# Altium footprint library SOCKET_CARD.PcbLib: 22 footprints (part 2 of 2)
Each footprint in its own frame and in the unit in brackets; x right, y up, seen from the top. Pads: shape width x height; smd on the part's side, far side on the other; paste and mask are expansions set on the pad; w line width, h text height; cw(c..) or ccw(c..) is an arc to the next point about the centre after c.
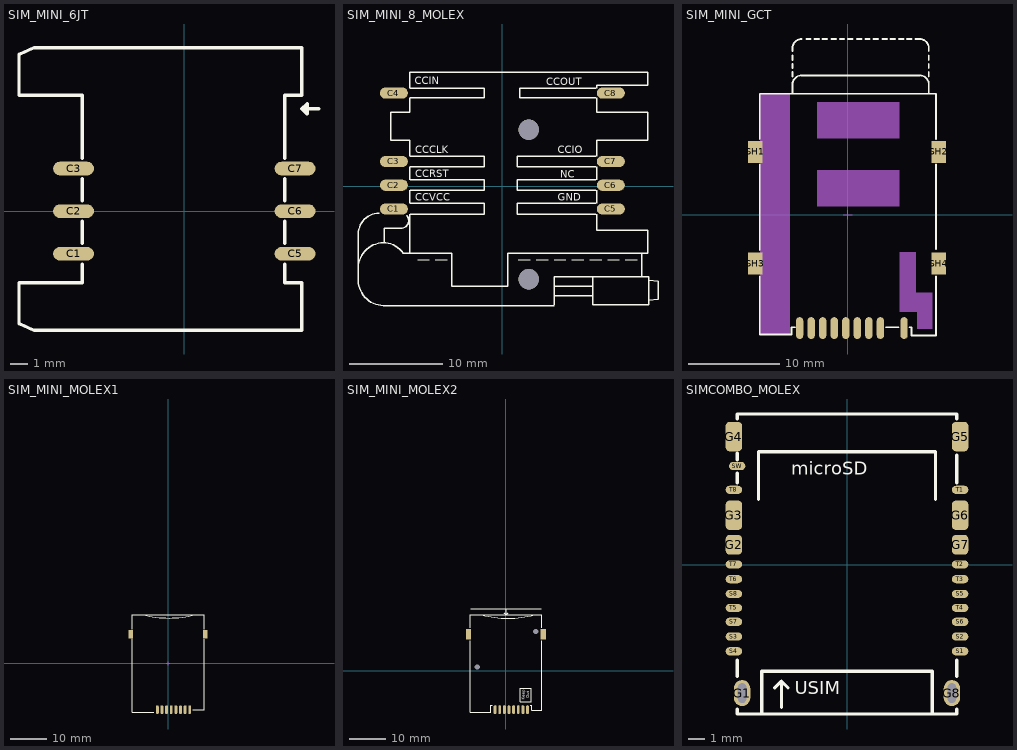
[diagram p1: the footprints below, top view; thin cyan lines are the x and y axes]

## SIM_MINI_6JT [mm] "SIM MINI, JTCONN"
height 0.254
pads (6):
  oval 2.4x0.8 smd: C1(-6.501,-2.499) C2(-6.501,0) C3(-6.501,2.499) C5(6.501,-2.499) C6(6.501,0) C7(6.501,2.499)
Top Overlay:
  lines w0.2: -9.7,-6.6 -8.8,-7 ; -9.7,-4.2 -6,-4.2 -6,-3.1 ; -8.8,9.6 -9.7,9.2 -9.7,6.8 -6,6.8 -6,3.1 ; -6,-1.9 -6,-0.6 ; -6,0.6 -6,1.9 ; 5.9,-3.1 5.9,-4.2 6.9,-4.2 ; 5.9,-1.9 5.9,-0.6 ; 5.9,0.6 5.9,1.9 ; 5.9,3.1 5.9,6.8 6.9,6.8 ; 7.9,6 6.9,6 ; 6.9,6 7.2,5.7 7.2,6.3 6.9,6
  lines w0.203: -9.7,-6.6 -9.7,-4.2 ; -8.8,-7 6.9,-7 6.9,-4.2 ; -8.8,9.6 6.9,9.6 6.9,6.8
3D body "User Library-Sim Card Holder.step": height 1.8, standoff 0, extent -9.55,-6.9 6.75,9.5
3D body "SIM card.STEP": height 1.55, standoff 0.75, extent -8.9,-6.2 16.1,8.8

## SIM_MINI_8_MOLEX [mm] "SIM 8P, MOLEX 91228-3001, 2.54mm Pitch ChipSIM Connector with Ejector, 6 Circuits, without Pegs, Yellow Button"
height 1.016
pads (10):
  oval 3x1.2 smd: C1(-11.608,-2.44) C2(-11.608,0.1) C3(-11.608,2.64) C4(-11.608,9.955) C5(11.608,-2.44) C6(11.608,0.1) C7(11.608,2.64) C8(11.608,9.955)
  round 2.184 hole 2.184 unplated: ""(2.826,-9.955) ""(2.826,6.045)
Top Overlay:
  lines w0.051: -9.068,-7.895 -7.798,-7.895 ; -7.163,-7.895 -5.893,-7.895 ; 1.727,-7.895 2.997,-7.895 ; 3.632,-7.895 4.902,-7.895 ; 5.537,-7.895 6.807,-7.895 ; 7.442,-7.895 8.712,-7.895 ; 9.347,-7.895 10.617,-7.895 ; 11.252,-7.895 12.522,-7.895 ; 13.157,-7.895 14.427,-7.895
  lines w0.152: -15.418,-8.714 cw(c-12.687,-8.777) -12.751,-6.047 cw(c-12.781,-8.714) -10.592,-7.19 ; -15.418,-5.155 -15.418,-10.111 ccw(c-12.687,-10.047) -12.751,-12.778 5.537,-12.778 ; -15.418,-5.102 cw(c-13.145,-5.155) -13.198,-2.882 ; -12.624,-4.523 -12.618,-4.523 ; -12.618,-6.047 -12.618,-4.523 ; -10.592,-7.205 -9.924,-7.205 ; -10.24,-3.137 cw(c-10.846,-3.697) -10.846,-4.523 -12.618,-4.523 ; -9.924,-2.999 -9.924,-7.205 ; -9.924,-1.856 -9.924,-0.459 ; -9.924,0.684 -9.924,2.081 ; -9.924,3.224 -9.924,4.93 -11.924,4.93 -11.924,7.93 -9.924,7.93 -9.924,9.447 ; -9.924,10.463 -9.924,12.168 15.576,12.168 15.576,10.795 10.076,10.795 10.076,10.463 ; -9.83,-2.999 -1.956,-2.999 -1.956,-1.856 -9.83,-1.856 ; -9.83,-0.459 -1.956,-0.459 -1.956,0.684 -9.83,0.684 ; -9.83,2.081 -1.956,2.081 -1.956,3.224 -9.83,3.224 ; -9.83,9.447 -1.956,9.447 -1.956,10.463 -9.83,10.463 ; 5.576,-12.705 5.576,-11.705 ; 9.982,-2.999 1.6,-2.999 1.6,-1.856 9.982,-1.856 ; 9.982,-0.459 1.6,-0.459 1.6,0.684 9.982,0.684 ; 9.982,2.081 1.6,2.081 1.6,3.224 9.982,3.224 ; 9.982,9.447 1.854,9.447 1.854,10.463 9.982,10.463 ; 10.076,-2.999 10.076,-4.705 15.576,-4.705 15.576,-7.205 14.916,-7.205 ; 10.076,-1.856 10.076,-0.459 ; 10.076,0.684 10.076,2.081 ; 10.076,3.224 10.076,4.93 15.576,4.93 15.576,7.93 10.076,7.93 10.076,9.447 ; -9.924,-7.205 -5.424,-7.205 -5.424,-10.705 0.576,-10.705 0.576,-7.205 14.916,-7.205 ; 5.576,-11.705 5.576,-10.705 ; 5.576,-11.705 9.655,-11.705 ; 5.576,-10.705 5.576,-9.705 9.655,-9.705 ; 5.576,-10.705 9.655,-10.705 ; 9.655,-11.705 9.655,-12.705 15.655,-12.705 15.655,-12.213 ; 9.655,-11.705 9.655,-10.705 ; 9.655,-10.705 9.655,-9.705 ; 9.655,-9.705 14.916,-9.705 ; 14.916,-9.705 15.655,-9.705 15.655,-10.07 ; 14.916,-9.705 14.916,-7.205 ; 15.655,-12.213 16.655,-12.086 16.655,-10.197 15.655,-10.07 ; 15.655,-12.213 15.655,-10.07
  text "GND" at 5.901,-1.58 h0.8
  text "NC" at 6.2,0.9 h0.8
  text "CCIO" at 5.901,3.5 h0.8
  text "CCOUT" at 4.7,10.8 h0.8
  text "CCIN" at -9.4,10.9 h0.8
  text "CCCLK" at -9.339,3.5 h0.8
  text "CCRST" at -9.339,0.96 h0.8
  text "CCVCC" at -9.339,-1.58 h0.8
3D body "User Library-912283001.STEP": height 3.1, standoff 0, extent -15.297,-12.832 16.903,12.168
3D body "SIM card.STEP": height 2.4, standoff 1.6, extent -10.2,-7.9 14.8,7.1

## SIM_MINI_GCT [mm] "SIM MINI, GCT SIM4056 pitch: 1.27mm 26.3x19.3mm"
height 1.8
pads (13):
  oval 0.8x2.4 smd: C1(-5.315,-12.5) C2(-2.775,-12.5) C3(-0.235,-12.5) C4(2.305,-12.5) C5(-4.045,-12.5) C6(-1.505,-12.5) C7(1.035,-12.5) C8(3.575,-12.5) S1(6.185,-12.5)
  rect 1.6x2.4 smd: SH1(-10.2,6.9) SH2(10,6.9) SH3(-10.2,-5.4) SH4(10,-5.4)
Top Overlay:
  lines w0.2: -9.715,-6.8 -9.715,-13.2 -6.215,-13.2 -6.215,-12.4 -5.815,-12.4 ; -9.715,8.3 -9.715,13.3 9.685,13.3 9.685,8.3 ; -9.7,-3.9 -9.7,5.5 ; -6.1,15.2 -6.1,15.7 ; -6.1,16.1 -6.1,16.6 ; -6.1,17 -6.1,17.5 ; -6.098,13.3 -6.098,14.326 cw(c-5.096,14.325) -5.096,15.328 7.903,15.328 cw(c7.903,14.325) 8.905,14.326 8.905,13.3 ; -6.098,18 -6.098,18.327 cw(c-5.096,18.327) -5.096,19.329 ; -6.02,18.708 -5.999,18.736 ; -5.964,18.814 -5.928,18.884 -5.802,19.033 ; -4.596,19.327 -4.096,19.327 ; -3.696,19.327 -3.196,19.327 ; -2.796,19.327 -2.296,19.327 ; -1.796,19.325 -1.296,19.325 ; -0.896,19.325 -0.396,19.325 ; 0.004,19.325 0.504,19.325 ; 1.004,19.323 1.504,19.323 ; 1.904,19.323 2.404,19.323 ; 2.804,19.323 3.304,19.323 ; 3.804,19.32 4.304,19.32 ; 4.185,-12.4 5.585,-12.4 ; 4.704,19.32 5.204,19.32 ; 5.604,19.32 6.104,19.32 ; 6.504,19.32 7.004,19.32 ; 6.785,-12.4 6.985,-12.4 6.985,-13.3 9.685,-13.3 9.685,-6.8 ; 7.404,19.32 7.903,19.32 ; 7.903,19.329 cw(c7.903,18.327) 8.905,18.327 8.905,18 ; 8.609,19.033 8.736,18.884 8.771,18.814 ; 8.807,18.736 8.828,18.708 ; 8.908,15.2 8.908,15.7 ; 8.908,16.1 8.908,16.6 ; 8.908,17 8.908,17.5 ; 9.7,-3.8 9.7,5.5
Mechanical 1:
  rectangle: -9.7,-13.2 -6.4,13.3
  rectangle: -3.4,8.4 5.7,12.4
  rectangle: -3.4,0.9 5.7,4.9
  rectangle: 7.6,-12.6 9.3,-8.6
  rectangle: 5.7,-10.7 9.3,-8.6
  rectangle: 5.7,-10.7 7.5,-4.1
  lines w0.1: -0.515,0 0.485,0 ; -0.015,-0.5 -0.015,0.5
  text "AVOID EXOPESED COPPER" at -4.5,6.2 h1
3D body "SIM4065-8-1-15-00-A_revA.STEP": height 1.8, standoff 0.15, extent -10.515,-13.2 10.485,13.2
3D body "SIM card.STEP": height 1.4, standoff 0.6, extent -6.1,-9.6 8.9,15.4

## SIM_MINI_MOLEX1 [mm] "SIM MINI, MOLEX PUSH PUSH pitch: 1.27mm 26.3x19.3mm"
height 1.8
pads (10):
  oval 0.8x2.4 smd: C1(-2.95,-12.7) C2(-0.41,-12.7) C3(2.13,-12.7) C5(-1.68,-12.7) C6(0.86,-12.7) C7(3.4,-12.7) S1(4.67,-12.7) S2(5.94,-12.7)
  rect 1.2x2.4 smd: SH1(-10.2,8) SH2(10.2,8)
Top Overlay:
  lines w0.2: -9.9,6.7 -9.9,-13.4 -4,-13.4 ; -9.9,9.3 -9.9,13.4 9.9,13.4 9.9,9.4 ; -6.994,13.4 ccw(c0.253,40.446) 7.5,13.4 ; 6.8,-12.8 9.9,-12.8 9.9,6.6
Mechanical 1:
  lines w0.1: -0.5,0 0.5,0 ; 0,-0.5 0,0.5
3D body "SIM card.STEP": height 1.55, standoff 0.75, extent -5.9,-9.5 9.1,15.5
3D body "MINI-SIM-MOLEX.stp": height 1.84, standoff 0.01, extent -10.5,-13.25 10.45,13.25

## SIM_MINI_MOLEX2 [mm] "SIM MINI, with Locator, MOLEX 47553-1001"
pads (12):
  oval 0.8x2.4 smd mask+0.051: C1(-2.985,-10.7) C2(-0.445,-10.7) C3(2.095,-10.7) C5(-1.715,-10.7) C6(0.825,-10.7) C7(3.365,-10.7) S1(4.635,-10.7) S2(5.905,-10.7)
  rect 1.5x2.95 smd: SH1(-10.275,9.965) SH2(10.275,9.965)
  rrect70% 0x0 hole 1.4: ""(-7.885,0.935) ""(8.165,10.735)
Top Overlay:
  lines w0.2: -9.775,8.165 -9.775,-11.385 -4.195,-11.385 -4.195,-9.545 -3.805,-9.545 ; -9.775,11.765 -9.775,15.3 9.775,15.3 9.775,11.765 ; -9.675,17.015 9.675,17.015 ; -6.694,15.3 ccw(c0.553,42.346) 7.8,15.3 ; -0.595,15.865 0.005,15.265 ; 0.005,17 0.005,15.265 ; 0.605,15.865 0.005,15.265 ; 6.705,-9.535 7.105,-9.535 7.105,-10.835 9.775,-10.835 9.775,8.165 ; 3.975,-8.485 3.975,-4.785 6.975,-4.785 6.975,-8.485 3.975,-8.485
  text "Out" at 6.405,-7.635 h0.8
  text "Keep" at 5.105,-8.035 h0.8
Mechanical 29:
  text ".Designator" at 4.805,-0.235 h1.52
3D body "475531001.stp": height 1.8, standoff -0.7, extent -10.445,-11.285 10.505,15.215
3D body "SIM card.STEP": height 1.55, standoff 0.75, extent -5.9,-8 9.1,17

## SIMCOMBO_MOLEX [mm] "MOLEX MICROSIM+SD SOCKET 104168-1620"
height 2.3
pads (25):
  oval 1x1.6 hole 0.5 slot 1.2 at 90 deg: G1(-6.4,-7.825) G8(6.4,-7.825)
  rrect50% 1x1.2 smd: G2(-6.9,1.225) G7(6.9,1.225)
  rrect50% 1x1.8 smd: G3(-6.9,3.025) G4(-6.9,7.825) G5(6.9,7.825) G6(6.9,3.025)
  oval 1x0.5 smd: S1(6.9,-5.275) S2(6.9,-4.375) S3(-6.9,-4.375) S4(-6.9,-5.275) S5(6.9,-1.775) S6(6.9,-3.475) S7(-6.9,-3.475) S8(-6.9,-1.775) SW(-6.7,6.025) T1(6.9,4.575) T2(6.9,0.025) T3(6.9,-0.875) T4(6.9,-2.625) T5(-6.9,-2.625) T6(-6.9,-0.875) T7(-6.9,0.025) T8(-6.9,4.575)
Top Overlay:
  lines w0.2: -6.7,-8.8 -6.7,-9.1 6.7,-9.1 6.7,-8.8 ; -6.7,-6.8 -6.7,-5.8 ; -6.7,5 -6.7,5.6 ; -6.7,6.4 -6.7,6.8 ; -6.7,8.9 -6.7,9.2 6.7,9.2 6.7,8.9 ; -5.4,4 -5.4,6.9 5.4,6.9 5.4,4 ; -5.2,-9.1 -5.2,-6.5 5.2,-6.5 5.2,-9.1 ; -4.4,-7.5 -4,-7.1 ; -4,-8.7 -4,-7.1 ; -3.6,-7.5 -4,-7.1 ; 6.7,-6.8 6.7,-5.8 ; 6.7,5 6.7,6.7
  text "USIM" at -3.2,-7.9 h0.8
  text "microSD" at -3.4,5.5 h0.8
3D body "1041681620.stp": height 2.25, standoff -0.7, extent -7.05,-9.025 7.05,9.275